# Altium footprint library WE Inductors.PcbLib: 131 footprints (part 6 of 9)
Each footprint in its own frame and in the unit in brackets; x right, y up, seen from the top. Pads: shape width x height; smd on the part's side, far side on the other; paste and mask are expansions set on the pad; w line width, h text height; cw(c..) or ccw(c..) is an arc to the next point about the centre after c.
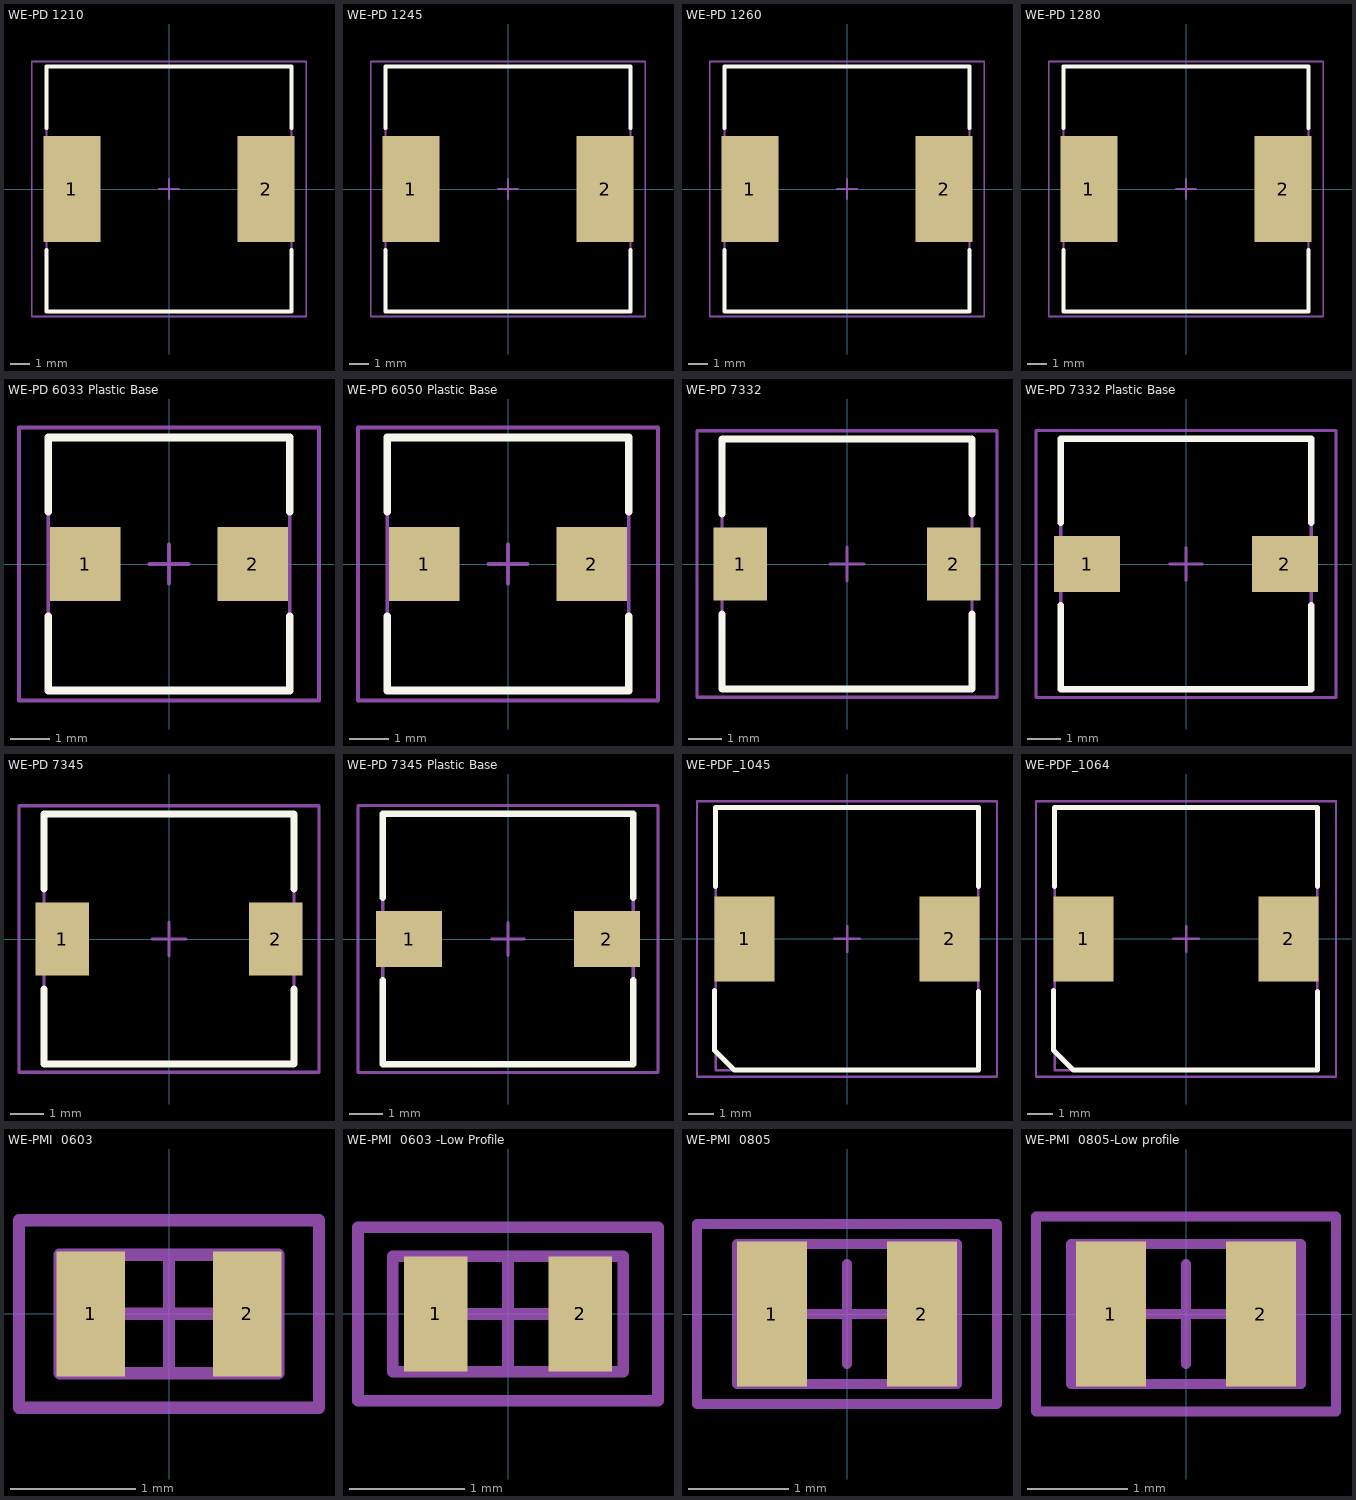
[diagram p5: the footprints below, top view; thin cyan lines are the x and y axes]

## WE-PD 1210 [mm] "SMD Inductor, 2-Leads, Body 12,0x12,0mm"
height 10
pads (2):
  rect 2.9x5.4 smd: 1(-4.95,0) 2(4.95,0)
Top Overlay:
  lines w0.2: -6.25,-3.1 -6.25,-6.25 6.25,-6.25 6.25,-3.1 ; -6.25,3.1 -6.25,6.25 6.25,6.25 6.25,3.1
Mechanical 13:
  lines w0.1: -6.25,-6.25 6.25,-6.25 6.25,6.25 -6.25,6.25 -6.25,-6.25
Mechanical 15:
  lines w0.1: -0.5,0 0.5,0 ; 0,-0.5 0,0.5 ; -7,-6.5 7,-6.5 7,6.5 -7,6.5 -7,-6.5
3D body: height 10.36, standoff -0.01, extent -6,-6 6,6

## WE-PD 1245 [mm] "SMD Inductor, 2-Leads, Body 12,0x12,0mm"
height 4.5
pads (2):
  rect 2.9x5.4 smd: 1(-4.95,0) 2(4.95,0)
Top Overlay:
  lines w0.2: -6.25,-3.1 -6.25,-6.25 6.25,-6.25 6.25,-3.1 ; -6.25,3.1 -6.25,6.25 6.25,6.25 6.25,3.1
Mechanical 13:
  lines w0.1: -6.25,-6.25 6.25,-6.25 6.25,6.25 -6.25,6.25 -6.25,-6.25
Mechanical 15:
  lines w0.1: -0.5,0 0.5,0 ; 0,-0.5 0,0.5 ; -7,-6.5 7,-6.5 7,6.5 -7,6.5 -7,-6.5
3D body: height 4.49, standoff -0.01, extent -6,-6 6,6

## WE-PD 1260 [mm] "SMD Inductor, 2-Leads, Body 12,0x12,0mm"
height 6
pads (2):
  rect 2.9x5.4 smd: 1(-4.95,0) 2(4.95,0)
Top Overlay:
  lines w0.2: -6.25,-3.1 -6.25,-6.25 6.25,-6.25 6.25,-3.1 ; -6.25,3.1 -6.25,6.25 6.25,6.25 6.25,3.1
Mechanical 13:
  lines w0.1: -6.25,-6.25 -6.25,6.25 6.25,6.25 6.25,-6.25 -6.25,-6.25
Mechanical 15:
  lines w0.1: -0.5,0 0.5,0 ; 0,-0.5 0,0.5 ; -7,-6.5 -7,6.5 7,6.5 7,-6.5 -7,-6.5
3D body: height 5.98, standoff -0.02, extent -6,-6 6,6

## WE-PD 1280 [mm] "SMD Inductor, 2-Leads, Body 12,0x12,0mm"
height 8
pads (2):
  rect 2.9x5.4 smd: 1(-4.95,0) 2(4.95,0)
Top Overlay:
  lines w0.2: -6.25,-3.1 -6.25,-6.25 6.25,-6.25 6.25,-3.1 ; -6.25,3.1 -6.25,6.25 6.25,6.25 6.25,3.1
Mechanical 13:
  lines w0.1: -6.25,-6.25 -6.25,6.25 6.25,6.25 6.25,-6.25 -6.25,-6.25
Mechanical 15:
  lines w0.1: -0.5,0 0.5,0 ; 0,-0.5 0,0.5 ; -7,-6.5 -7,6.5 7,6.5 7,-6.5 -7,-6.5
3D body: height 7.99, standoff -0.01, extent -6,-6 6,6

## WE-PD 6033 Plastic Base [mm] "SMD Inductor, 2-Leads, Body 5,9x6,2mm"
height 3.3
pads (2):
  rect 1.8x1.9 smd: 1(-2.15,0) 2(2.15,0)
Top Overlay:
  lines w0.2: -3.1,-1.35 -3.1,-3.25 3.1,-3.25 3.1,-1.35 ; -3.1,1.35 -3.1,3.25 3.1,3.25 3.1,1.35
Mechanical 13:
  lines w0.1: -3.1,-3.25 3.1,-3.25 3.1,3.25 -3.1,3.25 -3.1,-3.25
Mechanical 15:
  lines w0.1: -0.5,0 0.5,0 ; 0,-0.5 0,0.5 ; -3.85,-3.5 3.85,-3.5 3.85,3.5 -3.85,3.5 -3.85,-3.5
3D body: height 3.29, standoff -0.01, extent -2.95,-3.1 2.95,3.1

## WE-PD 6050 Plastic Base [mm] "SMD Inductor, 2-Leads, Body 5,9x6,2mm"
height 5
pads (2):
  rect 1.8x1.9 smd: 1(-2.15,0) 2(2.15,0)
Top Overlay:
  lines w0.2: -3.1,-1.35 -3.1,-3.25 3.1,-3.25 3.1,-1.35 ; -3.1,1.35 -3.1,3.25 3.1,3.25 3.1,1.35
Mechanical 13:
  lines w0.1: -3.1,-3.25 -3.1,3.25 3.1,3.25 3.1,-3.25 -3.1,-3.25
Mechanical 15:
  lines w0.1: -0.5,0 0.5,0 ; 0,-0.5 0,0.5 ; -3.85,-3.5 -3.85,3.5 3.85,3.5 3.85,-3.5 -3.85,-3.5
3D body: height 5.09, standoff -0.01, extent -2.95,-3.1 2.95,3.1

## WE-PD 7332 [mm] "SMD Inductor, 2-Leads, Body 7,3x7,3mm"
height 3.4
pads (2):
  rect 1.6x2.2 smd: 1(-3.2,0) 2(3.2,0)
Top Overlay:
  lines w0.2: -3.75,-1.5 -3.75,-3.75 3.75,-3.75 3.75,-1.5 ; -3.75,1.5 -3.75,3.75 3.75,3.75 3.75,1.5
Mechanical 13:
  lines w0.1: -3.75,-3.75 3.75,-3.75 3.75,3.75 -3.75,3.75 -3.75,-3.75
Mechanical 15:
  lines w0.1: -0.5,0 0.5,0 ; 0,-0.5 0,0.5 ; -4.5,-4 4.5,-4 4.5,4 -4.5,4 -4.5,-4
3D body: height 3.19, standoff -0.01, extent -3.65,-3.65 3.65,3.65

## WE-PD 7332 Plastic Base [mm] "SMD Inductor, 2-Leads, Body 7,3x7,3mm"
height 3.2
pads (2):
  rect 2x1.7 smd: 1(-3,0) 2(3,0)
Top Overlay:
  lines w0.2: -3.8,-1.25 -3.8,-3.8 3.8,-3.8 3.8,-1.25 ; -3.8,1.25 -3.8,3.8 3.8,3.8 3.8,1.25
Mechanical 13:
  lines w0.1: -3.8,-3.8 3.8,-3.8 3.8,3.8 -3.8,3.8 -3.8,-3.8
Mechanical 15:
  lines w0.1: -0.5,0 0.5,0 ; 0,-0.5 0,0.5 ; -4.55,-4.05 4.55,-4.05 4.55,4.05 -4.55,4.05 -4.55,-4.05
3D body: height 3.19, standoff -0.01, extent -3.65,-3.65 3.65,3.65

## WE-PD 7345 [mm] "SMD Inductor, 2-Leads, Body 7,3x7,3mm"
height 4.5
pads (2):
  rect 1.6x2.2 smd: 1(-3.2,0) 2(3.2,0)
Top Overlay:
  lines w0.2: -3.75,-1.5 -3.75,-3.75 3.75,-3.75 3.75,-1.5 ; -3.75,1.5 -3.75,3.75 3.75,3.75 3.75,1.5
Mechanical 13:
  lines w0.1: -3.75,-3.75 3.75,-3.75 3.75,3.75 -3.75,3.75 -3.75,-3.75
Mechanical 15:
  lines w0.1: -0.5,0 0.5,0 ; 0,-0.5 0,0.5 ; -4.5,-4 4.5,-4 4.5,4 -4.5,4 -4.5,-4
3D body: height 4.49, standoff -0.01, extent -3.65,-3.7 3.65,3.6

## WE-PD 7345 Plastic Base [mm] "SMD Inductor, 2-Leads, Body 7,3x7,3mm"
height 4.5
pads (2):
  rect 2x1.7 smd: 1(-3,0) 2(3,0)
Top Overlay:
  lines w0.2: -3.8,-1.25 -3.8,-3.8 3.8,-3.8 3.8,-1.25 ; -3.8,1.25 -3.8,3.8 3.8,3.8 3.8,1.25
Mechanical 13:
  lines w0.1: -3.8,-3.8 3.8,-3.8 3.8,3.8 -3.8,3.8 -3.8,-3.8
Mechanical 15:
  lines w0.1: -0.5,0 0.5,0 ; 0,-0.5 0,0.5 ; -4.55,-4.05 4.55,-4.05 4.55,4.05 -4.55,4.05 -4.55,-4.05
3D body: height 4.09, standoff -0.01, extent -3.65,-3.65 3.65,3.65

## WE-PDF_1045 [mm] "SMD Inductor, 2-Leads, Body 10,2x10,2mm"
height 4.5
pads (2):
  rect 2.4x3.4 smd: 1(-4.1,0) 2(4.1,0)
Top Overlay:
  lines w0.2: -5.3,-4.45 -5.3,-2.05 ; -5.25,2.1 -5.25,5.25 5.25,5.25 5.25,2.1 ; 5.25,-2.1 5.25,-5.25 -4.5,-5.25 ; -4.5,-5.25 -5.25,-4.5 -4.5,-5.25
Mechanical 13:
  lines w0.1: -5.25,-5.25 5.25,-5.25 5.25,5.25 -5.25,5.25 -5.25,-5.25
Mechanical 15:
  lines w0.1: -0.5,0 0.5,0 ; 0,-0.5 0,0.5 ; -6,-5.5 6,-5.5 6,5.5 -6,5.5 -6,-5.5
3D body: height 4.49, standoff -0.01, extent -5.1,-5.1 5.1,5.1

## WE-PDF_1064 [mm] "SMD Inductor, 2-Leads, Body 10,2x10,2mm"
height 6.4
pads (2):
  rect 2.4x3.4 smd: 1(-4.1,0) 2(4.1,0)
Top Overlay:
  lines w0.2: -5.3,-2.05 -5.3,-4.45 -4.5,-5.25 ; -5.25,-4.5 -4.5,-5.25 ; -5.25,2.1 -5.25,5.25 5.25,5.25 5.25,2.1 ; 5.25,-2.1 5.25,-5.25 -4.5,-5.25
Mechanical 13:
  lines w0.1: -5.25,-5.25 -5.25,5.25 5.25,5.25 5.25,-5.25 -5.25,-5.25
Mechanical 15:
  lines w0.1: -0.5,0 0.5,0 ; 0,-0.5 0,0.5 ; -6,-5.5 -6,5.5 6,5.5 6,-5.5 -6,-5.5
3D body: height 6.39, standoff -0.01, extent -5.1,-5.1 5.1,5.1

## WE-PMI  0603 [mm] "Molded Inductor, 2-Leads, Body 1,6x0,8mm"
height 0.95
pads (2):
  rect 0.55x1 smd: 1(-0.625,0) 2(0.625,0)
Mechanical 13:
  lines w0.1: -0.875,-0.475 0.875,-0.475 0.875,0.475 -0.875,0.475 -0.875,-0.475
Mechanical 15:
  lines w0.1: -0.475,0 0.475,0 ; 0,-0.475 0,0.475 ; -1.2,-0.75 1.2,-0.75 1.2,0.75 -1.2,0.75 -1.2,-0.75
  text ".Designator" at 0,0 h0.76
3D body: height 0.78, standoff -0.01, extent -0.8,-0.4 0.8,0.4

## WE-PMI  0603 -Low Profile [mm] "Chip Inductor, 2-Leads, Body 1.6x0.8mm, IPC Medium Density"
height 0.55
pads (2):
  rect 0.55x1 smd: 1(-0.625,0) 2(0.625,0)
Mechanical 13:
  lines w0.1: -1,-0.5 1,-0.5 1,0.5 -1,0.5 -1,-0.5
Mechanical 15:
  lines w0.1: -0.475,0 0.475,0 ; 0,-0.475 0,0.475 ; -1.3,-0.75 1.3,-0.75 1.3,0.75 -1.3,0.75 -1.3,-0.75
  text ".Designator" at 0,0 h0.76
3D body: height 0.48, standoff -0.02, extent -0.8,-0.4 0.8,0.4

## WE-PMI  0805 [mm] "Molded Inductor, 2-Leads, Body 2,0x1,2mm"
height 1
pads (2):
  rect 0.7x1.45 smd: 1(-0.75,0) 2(0.75,0)
Mechanical 13:
  lines w0.1: -1.1,-0.7 1.1,-0.7 1.1,0.7 -1.1,0.7 -1.1,-0.7
Mechanical 15:
  lines w0.1: -0.5,0 0.5,0 ; 0,-0.5 0,0.5 ; -1.5,-0.9 1.5,-0.9 1.5,0.9 -1.5,0.9 -1.5,-0.9
  text ".Designator" at 0,0 h0.76
3D body: height 0.99, standoff -0.01, extent -1,-0.6 1,0.6

## WE-PMI  0805-Low profile [mm] "Chip Inductor, 2-Leads, Body 2.1x1.3mm, IPC Medium Density"
height 0.6
pads (2):
  rect 0.7x1.45 smd: 1(-0.75,0) 2(0.75,0)
Mechanical 13:
  lines w0.1: -1.15,-0.7 1.15,-0.7 1.15,0.7 -1.15,0.7 -1.15,-0.7
Mechanical 15:
  lines w0.1: -0.5,0 0.5,0 ; 0,-0.5 0,0.5 ; -1.5,-0.975 1.5,-0.975 1.5,0.975 -1.5,0.975 -1.5,-0.975
  text ".Designator" at 0,0 h0.76
3D body: height 0.48, standoff -0.02, extent -1,-0.625 1,0.625